# Altium footprint library FootprintSMD.PcbLib: 140 footprints (part 2 of 9)
Each footprint in its own frame and in the unit in brackets; x right, y up, seen from the top. Pads: shape width x height; smd on the part's side, far side on the other; paste and mask are expansions set on the pad; w line width, h text height; cw(c..) or ccw(c..) is an arc to the next point about the centre after c.
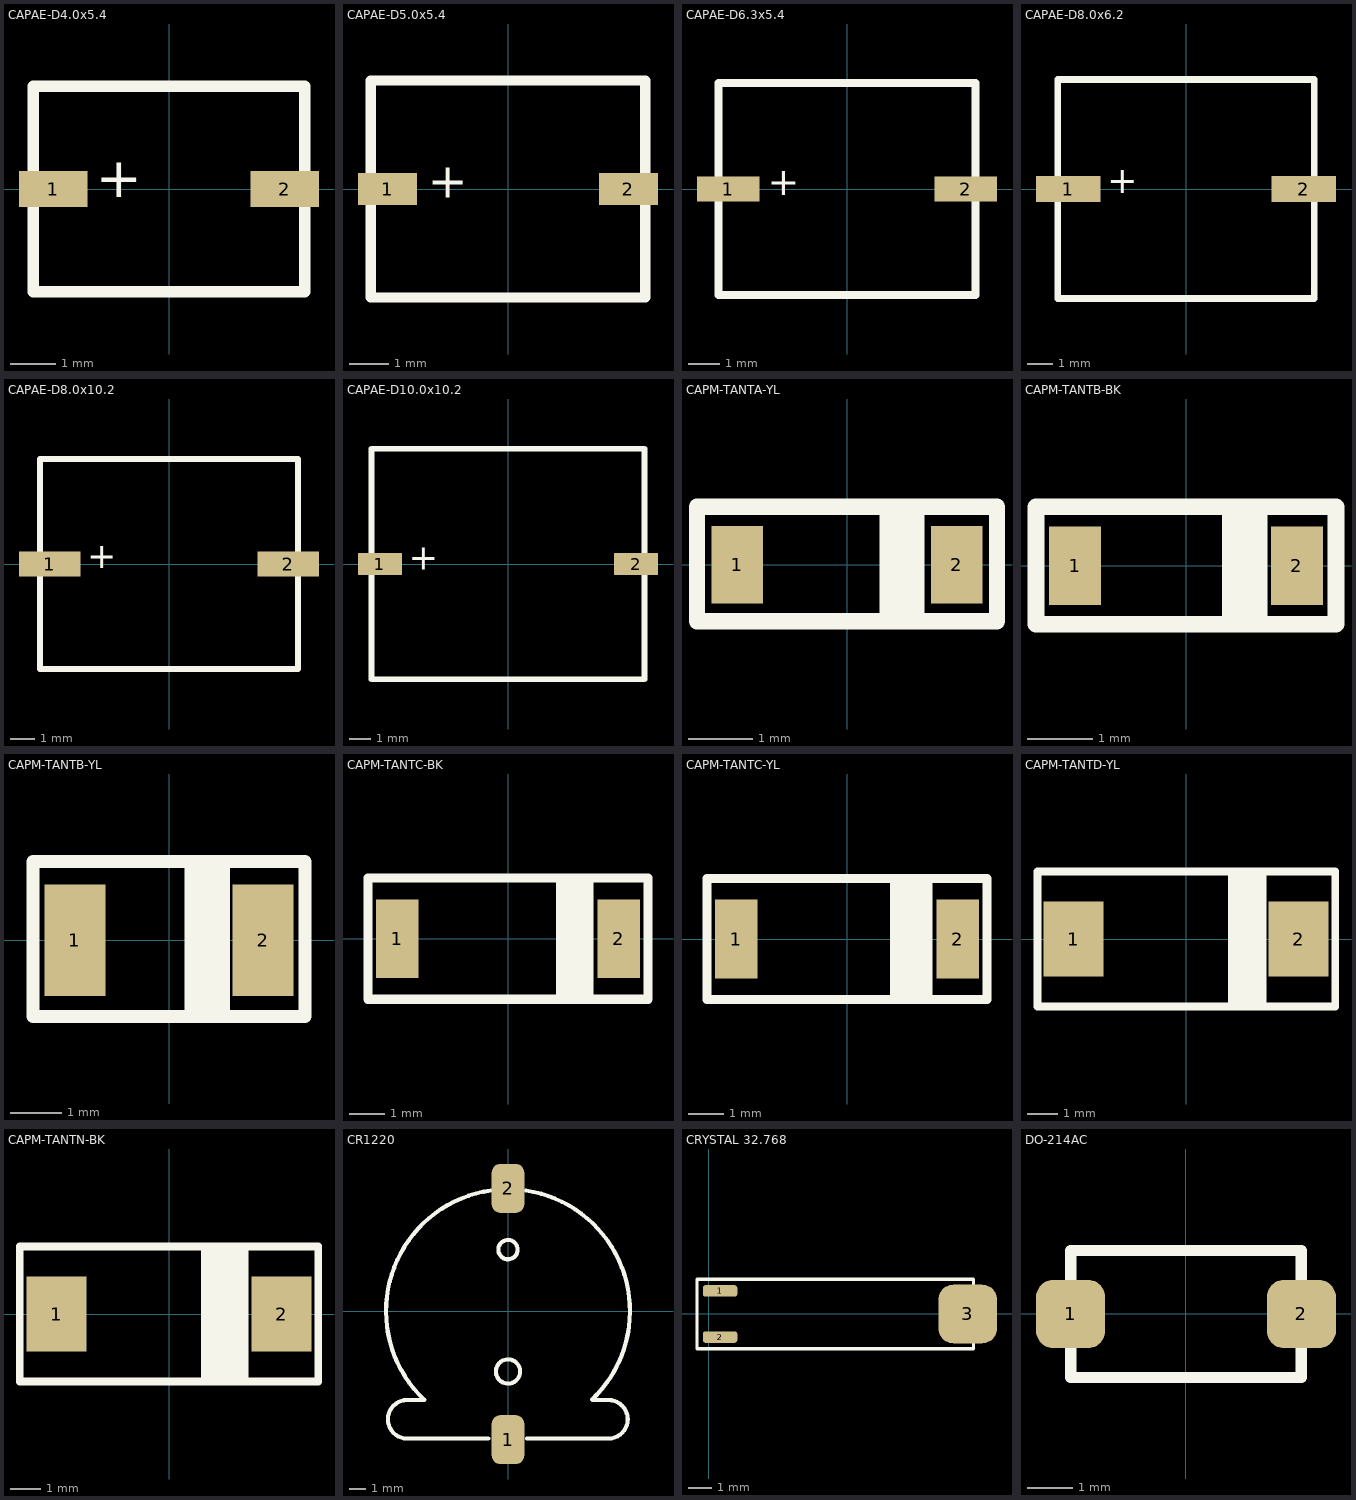
[diagram p1: the footprints below, top view; thin cyan lines are the x and y axes]

## CAPAE-D4.0x5.4 [mm]
pads (2):
  rect 1.5x0.8 smd: 1(-2.54,0) 2(2.54,0)
Top Overlay:
  lines w0.254: -2.975,-2.25 2.975,-2.25 2.975,2.25 -2.975,2.25 -2.975,-2.25
  text "+" at -1.611,-0.481 h1.52
3D body "CAPAE-D4.0x5.4.stp": height 5.5, standoff 0, extent -2.75,-2.25 2.75,2.25

## CAPAE-D5.0x5.4 [mm]
pads (2):
  rect 1.5x0.8 smd: 1(-3.048,0) 2(3.048,0)
Top Overlay:
  lines w0.254: -3.475,-2.75 -3.475,2.75 3.475,2.75 3.475,-2.75 -3.475,-2.75
  text "+" at -2.032,-0.508 h1.52
3D body "CAPAE-D5.0x5.4.stp": height 5.5, standoff 0, extent -3.25,-2.75 3.25,2.75

## CAPAE-D6.3x5.4 [mm]
pads (2):
  rect 2x0.8 smd: 1(-3.81,0) 2(3.81,0)
Top Overlay:
  lines w0.254: -4.125,-3.4 -4.125,3.4 4.125,3.4 4.125,-3.4 -4.125,-3.4
  text "+" at -2.54,-0.508 h1.52
3D body "CAPAE-D6.3x5.4.stp": height 5.5, standoff 0, extent -3.9,-3.4 3.9,3.4

## CAPAE-D8.0x6.2 [mm]
pads (2):
  rect 2.5x1 smd: 1(-4.572,0) 2(4.572,0)
Top Overlay:
  lines w0.254: -4.975,-4.25 4.975,-4.25 4.975,4.25 -4.975,4.25 -4.975,-4.25
  text "+" at -3.048,-0.508 h1.78
3D body "CAPAE-D8.0x6.2.stp": height 6.5, standoff 0, extent -4.75,-4.25 4.75,4.25

## CAPAE-D8.0x10.2 [mm]
pads (2):
  rect 2.5x1 smd: 1(-4.826,0) 2(4.826,0)
Top Overlay:
  lines w0.254: -5.225,-4.25 5.225,-4.25 5.225,4.25 -5.225,4.25 -5.225,-4.25
  text "+" at -3.302,-0.508 h1.78
3D body "CAPAE-D8.0x10.2.stp": height 10.5, standoff 0, extent -5,-4.25 5,4.25

## CAPAE-D10.0x10.2 [mm]
pads (2):
  rect 2x1 smd: 1(-5.842,0) 2(5.842,0)
Top Overlay:
  lines w0.254: -6.225,-5.25 6.225,-5.25 6.225,5.25 -6.225,5.25 -6.225,-5.25
  text "+" at -4.519,-0.641 h2.03
3D body "CAPAE-D10.0x10.2.stp": height 10.5, standoff 0, extent -6,-5.25 6,5.25

## CAPM-TANTA-YL [mm]
pads (2):
  rect 0.8x1.2 smd: 1(-1.7,0) 2(1.7,0)
Top Overlay:
  rectangle: 0.5,-0.875 1.2,0.9
  lines w0.254: -2.325,-0.875 2.325,-0.875 2.325,0.9 -2.325,0.9 -2.325,-0.875
3D body "CAPM-TANTA-BK.stp": height 1.8, standoff 0, extent -1.7,-0.9 1.7,0.9

## CAPM-TANTB-BK [mm]
pads (2):
  rect 0.8x1.2 smd: 1(-1.7,0) 2(1.7,0)
Top Overlay:
  rectangle: 0.55,-0.85 1.25,0.95
  lines w0.254: -2.3,-0.9 -2.3,0.9 2.3,0.9 2.3,-0.9 -2.3,-0.9
3D body "CAPM-TANTA-YL.stp": height 1.8, standoff 0, extent -1.7,-0.9 1.7,0.9

## CAPM-TANTB-YL [mm]
pads (2):
  rect 1.2x2.2 smd: 1(-1.85,0) 2(1.85,0)
Top Overlay:
  rectangle: 0.3,-1.5 1.2,1.55
  lines w0.254: -2.675,-1.5 2.675,-1.5 2.675,1.55 -2.675,1.55 -2.675,-1.5
3D body "CAPM-TANTB-YL.stp": height 2.1, standoff 0, extent -1.85,-1.5 1.85,1.5

## CAPM-TANTC-BK [mm]
pads (2):
  rect 1.2x2.2 smd: 1(-3.1,0) 2(3.1,0)
Top Overlay:
  rectangle: 1.35,-1.725 2.4,1.7
  lines w0.254: -3.925,-1.7 -3.925,1.7 3.925,1.7 3.925,-1.7 -2.825,-1.7 -3.925,-1.7
3D body "CAPM-TANTC-BK.stp": height 2.7, standoff 0, extent -3.1,-1.7 3.1,1.7

## CAPM-TANTC-YL [mm]
pads (2):
  rect 1.2x2.2 smd: 1(-3.1,0) 2(3.1,0)
Top Overlay:
  rectangle: 1.2,-1.7 2.4,1.7
  lines w0.254: -3.925,-1.7 3.925,-1.7 3.925,1.7 -3.925,1.7 -3.925,-1.7
3D body "CAPM-TANTC-YL.stp": height 2.8, standoff 0, extent -3.1,-1.7 3.1,1.7

## CAPM-TANTD-YL [mm]
pads (2):
  rect 2x2.5 smd: 1(-3.75,0) 2(3.75,0)
Top Overlay:
  rectangle: 1.4,-2.25 2.675,2.25
  lines w0.254: -4.95,-2.25 -4.95,2.25 4.975,2.25 4.975,-2.25 -4.95,-2.25
3D body "CAPM-TANTD-YL.stp": height 3.1, standoff 0, extent -3.75,-2.25 3.75,2.25

## CAPM-TANTN-BK [mm]
pads (2):
  rect 2x2.5 smd: 1(-3.75,0) 2(3.75,0)
Top Overlay:
  rectangle: 1.075,-2.25 2.65,2.225
  lines w0.254: -4.975,-2.25 -4.975,2.25 4.975,2.25 4.975,-2.25 -4.975,-2.25
3D body "CAPM-TANTN-BK.stp": height 3, standoff 0, extent -3.75,-2.25 3.75,2.25

## CR1220 [mm]
pads (2):
  rrect50% 2x3 smd: 1(0,-7.9) 2(0,7.55)
Top Overlay:
  circle w0.254: c0,-3.708 r0.747
  circle w0.254: c0,3.785 r0.594
  lines w0.254: -5.161,-5.463 -6.2,-5.463 ccw(c-6.2,-6.65) -6.2,-7.837 -1.213,-7.837 ; -5.15,-5.452 cw(c0,0) -1.057,7.425 ; 1.111,7.417 cw(c0,0) 5.164,-5.439 ; 1.162,-7.837 6.175,-7.837 ccw(c6.175,-6.65) 6.175,-5.463 5.187,-5.463
3D body "User Library-cr1220.STEP": height 4.04, standoff -0.9, extent -7.5,-9.425 7.497,9.075

## CRYSTAL 32.768 [mm]
pads (3):
  rrect50% 1.5x0.5 smd: 1(0.5,1) 2(0.5,-1)
  rrect50% 2.54x2.54 smd: 3(11.25,0)
Top Overlay:
  lines w0.15: -0.5,-1.5 11.5,-1.5 11.5,1.5 -0.5,1.5 -0.5,-1.5
3D body "User Library-32_768K.STEP": height 3, standoff 0, extent 0,-1.5 11.4,1.5

## DO-214AC [mil]
pads (2):
  rrect50% 60x59.06 smd: 1(-100,0) 2(100,0)
Top Overlay:
  lines w9.84: -100,-30 -100,-55 100,-55 100,-30 ; -100,30 -100,55 100,55 100,30
3D body "User Library-DO-214AC_SMA.STEP": height 84.69, standoff -1.97, extent -98.43,-53.15 98.42,53.15